# Altium footprint library DipComponent.PcbLib: 303 footprints (part 7 of 19)
Each footprint in its own frame and in the unit in brackets; x right, y up, seen from the top. Pads: shape width x height; smd on the part's side, far side on the other; paste and mask are expansions set on the pad; w line width, h text height; cw(c..) or ccw(c..) is an arc to the next point about the centre after c.
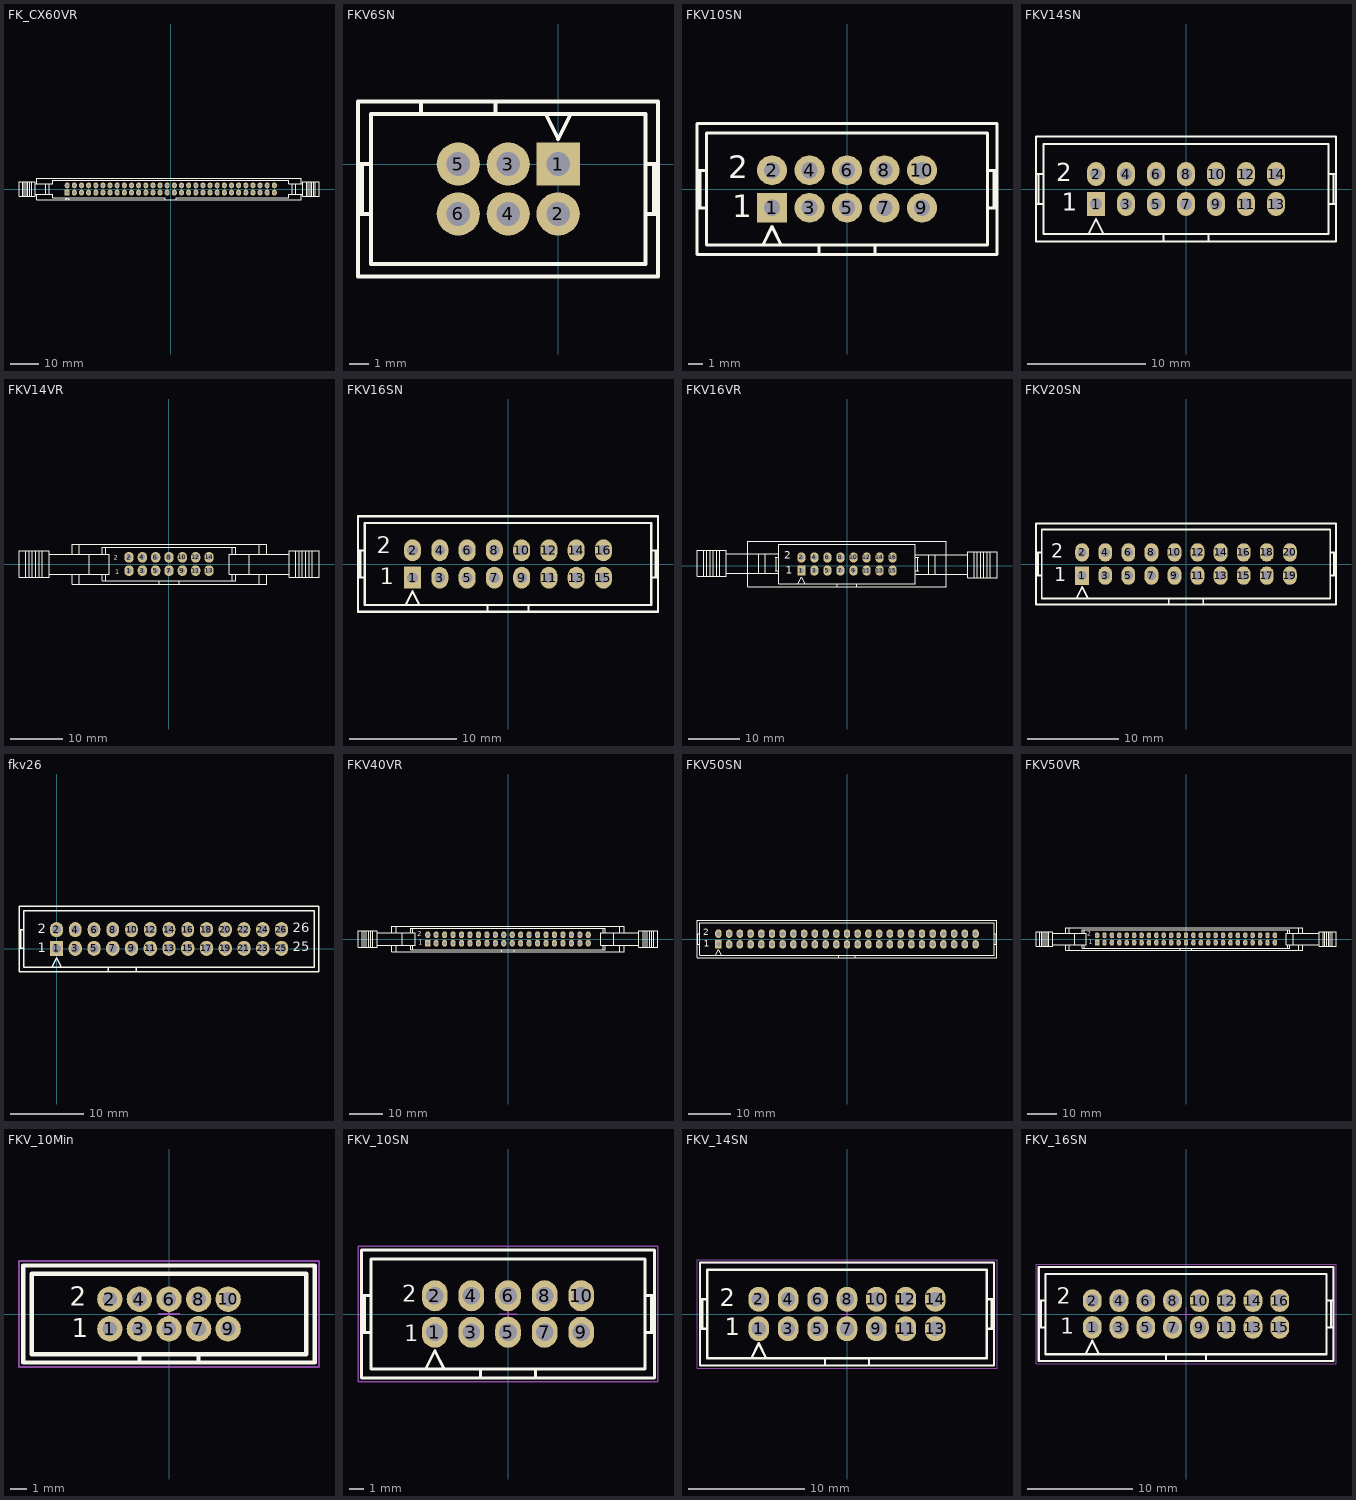
[diagram p6: the footprints below, top view; thin cyan lines are the x and y axes]

## FK_CX60VR [mil]
pads (60):
  rect 70x80 hole 43.31: 1(-1450,-50)
  oval 70x80 hole 43.31: 2(-1450,50) 3(-1350,-50) 4(-1350,50) 5(-1250,-50) 6(-1250,50) 7(-1150,-50) 8(-1150,50) 9(-1050,-50) 10(-1050,50) 11(-950,-50) 12(-950,50) 13(-850,-50) 14(-850,50) 15(-750,-50) 16(-750,50) 17(-650,-50) 18(-650,50) 19(-550,-50) 20(-550,50) 21(-450,-50) 22(-450,50) 23(-350,-50) 24(-350,50) 25(-250,-50) 26(-250,50) 27(-150,-50) 28(-150,50) 29(-50,-50) 30(-50,50) 31(50,-50) 32(50,50) 33(150,-50) 34(150,50) 35(250,-50) 36(250,50) 37(350,-50) 38(350,50) 39(450,-50) 40(450,50) 41(550,-50) 42(550,50) 43(650,-50) 44(650,50) 45(750,-50) 46(750,50) 47(850,-50) 48(850,50) 49(950,-50) 50(950,50) 51(1050,-50) 52(1050,50) 53(1150,-50) 54(1150,50) 55(1250,-50) 56(1250,50) 57(1350,-50) 58(1350,50) 59(1450,-50) 60(1450,50)
Top Overlay:
  lines w8: -2075,-100 -2075,100 ; -2050,-100 -2050,100 ; -2025,-100 -2025,100 ; -2000,-100 -2000,100 ; -1975,-100 -1975,100 ; -1950,-100 -1950,100 ; -1900,-75 -1650,-75 -1650,-125 -75,-125 -75,-150 ; -1900,75 -1650,75 -1650,125 1650,125 1650,75 1850,75 ; -1875,-75 -1875,-150 1825,-150 1825,-75 ; -1875,75 -1875,150 1825,150 1825,75 ; -1750,-75 -1750,75 ; -1700,-75 -1700,75 ; -1475,-150 -1450,-125 -1425,-150 ; 75,-150 75,-125 1650,-125 1650,-75 1850,-75 ; 1700,-75 1700,75 ; 1750,-75 1750,75 ; 1900,-100 1900,100 ; 1925,-100 1925,100 ; 1950,-100 1950,100 ; 1975,-100 1975,100 ; 2000,-100 2000,100 ; 2025,-100 2025,100 ; -2125,-100 -1900,-100 -1900,100 -2125,100 -2125,-100 ; 1850,-100 2075,-100 2075,100 1850,100 1850,-100

## FKV6SN [mm]
pads (6):
  rect 2.2x2.2 hole 1.2: 1(0,0)
  round 2.2 hole 1.2: 2(0,-2.54) 3(-2.54,0) 4(-2.54,-2.54) 5(-5.08,0) 6(-5.08,-2.54)
Top Overlay:
  lines w0.203: -10.18,-2.54 -9.525,-2.54 ; -10.18,0 -9.525,0 ; -9.98,-2.54 -9.98,0 ; -6.985,3.175 -6.985,2.54 ; -3.175,3.175 -3.175,2.54 ; -0.635,2.54 0,1.27 0.635,2.54 ; 4.445,-2.54 5.08,-2.54 ; 4.445,0 5.08,0 ; 4.868,-2.54 4.868,0 ; -6.985,2.54 -9.525,2.54 -9.525,-5.08 4.445,-5.08 4.445,2.54 -3.175,2.54 ; -6.985,2.54 -3.175,2.54 ; -10.18,-5.715 5.08,-5.715 5.08,3.175 -10.18,3.175 -10.18,-5.715
3D body "User Library-IDC Socket Male 6pin Straight THT Goldplated 2_54mm.STEP": height 8.91, standoff -3.49, extent -10.144,-5.932 5.076,2.918

## FKV10SN [mil]
pads (10):
  rect 80x80 hole 43.31: 1(-200,-50)
  round 80 hole 43.31: 2(-200,50) 3(-100,-50) 4(-100,50) 5(0,-50) 6(0,50) 7(100,-50) 8(100,50) 9(200,-50) 10(200,50)
Top Overlay:
  lines w8: -400,-50 -375,-50 ; -400,50 -375,50 ; -391.67,-50 -391.67,50 ; -225,-150 -200,-100 -175,-150 ; -75,-175 -75,-150 ; 75,-175 75,-150 ; 375,-50 400,-50 ; 375,50 400,50 ; 391.67,-50 391.67,50 ; -75,-150 75,-150 ; -75,-150 -375,-150 -375,150 375,150 375,-150 75,-150 ; -400,-175 400,-175 400,175 -400,175 -400,-175
  text "1" at -306,-76 h60
  text "2" at -317,29 h60

## FKV14SN [mil]
height 47.24
pads (14):
  rect 60x80 hole 39.37: 1(-300,-50)
  oval 60x80 hole 39.37: 2(-300,50) 3(-200,-50) 4(-200,50) 5(-100,-50) 6(-100,50) 7(0,-50) 8(0,50) 9(100,-50) 10(100,50) 11(200,-50) 12(200,50) 13(300,-50) 14(300,50)
Top Overlay:
  lines w8: -500,-50 -475,-50 ; -500,50 -475,50 ; -491.67,-50 -491.67,50 ; -325,-150 -300,-100 -275,-150 ; -75,-175 -75,-150 ; 75,-175 75,-150 ; 475,-50 500,-50 ; 475,50 500,50 ; 491.67,-50 491.67,50 ; -75,-150 -475,-150 -475,150 475,150 475,-150 75,-150 ; -75,-150 75,-150 ; -500,-175 -500,175 500,175 500,-175 -500,-175
  text "1" at -415,-73 h60
  text "2" at -432,26 h60

## FKV14VR [mil]
pads (14):
  oval 70x80 hole 39.37: 1(-299.78,-49.8) 2(-299.78,50.2) 3(-199.78,-49.8) 4(-199.78,50.2) 5(-99.78,-49.8) 6(-99.78,50.2) 7(0.22,-49.8) 8(0.22,50.2) 9(100.22,-49.8) 10(100.22,50.2) 11(200.22,-49.8) 12(200.22,50.2) 13(300.22,-49.8) 14(300.22,50.2)
Top Overlay:
  lines w8: -1074.78,-99.8 -1074.78,100.2 ; -1049.78,-99.8 -1049.78,100.2 ; -1024.78,-99.8 -1024.78,100.2 ; -999.78,-99.8 -999.78,100.2 ; -974.78,-99.8 -974.78,100.2 ; -949.78,-99.8 -949.78,100.2 ; -899.78,-74.8 -633.11,-74.8 -499.78,-74.8 ; -899.78,75.2 -633.11,75.2 -499.78,75.2 ; -724.78,-74.8 -724.78,-149.79 733.55,-149.79 733.55,-74.8 ; -724.78,75.2 -724.78,150.21 733.55,150.21 733.55,75.2 500.22,75.2 ; -674.78,-149.79 -674.78,-74.8 ; -674.78,75.2 -674.78,150.21 ; -599.78,-74.8 -599.78,75.2 ; -474.78,-124.8 -474.78,-74.8 ; -474.78,75.2 -474.78,125.2 ; -74.78,-149.79 -74.78,-124.8 ; 75.22,-149.79 75.22,-124.8 ; 475.22,-124.8 475.22,-74.8 ; 475.22,75.2 475.22,125.2 ; 600.22,-74.8 600.22,75.2 ; 633.55,75.2 900.22,75.2 ; 675.22,-149.79 675.22,-74.8 ; 675.22,75.2 675.22,150.21 ; 900.22,-74.8 633.55,-74.8 500.22,-74.8 ; 950.22,-99.8 950.22,100.2 ; 975.22,-99.8 975.22,100.2 ; 1000.22,-99.8 1000.22,100.2 ; 1025.22,-99.8 1025.22,100.2 ; 1050.22,-99.8 1050.22,100.2 ; 1075.22,-99.8 1075.22,100.2 ; -499.78,-74.8 -499.78,-124.8 -74.78,-124.8 ; -499.78,-74.8 -449.78,-74.8 -449.78,75.2 -499.78,75.2 ; -499.78,75.2 -499.78,125.2 500.22,125.2 500.22,75.2 ; -74.78,-124.8 75.22,-124.8 ; 75.22,-124.8 500.22,-124.8 500.22,-74.8 ; 500.22,-74.8 450.22,-74.8 450.22,75.2 500.22,75.2 ; -1124.78,-99.8 -899.78,-99.8 -899.78,100.2 -1124.78,100.2 -1124.78,-99.8 ; 900.22,-99.8 1125.22,-99.8 1125.22,100.2 900.22,100.2 900.22,-99.8
  text "1" at -401.78,-77.8 h35
  text "2" at -413.78,32.2 h35

## FKV16SN [mil]
pads (16):
  rect 62x80 hole 39.37: 1(-350,-50)
  oval 62x80 hole 39.37: 2(-350,50) 3(-250,-50) 4(-250,50) 5(-150,-50) 6(-150,50) 7(-50,-50) 8(-50,50) 9(50,-50) 10(50,50) 11(150,-50) 12(150,50) 13(250,-50) 14(250,50) 15(350,-50) 16(350,50)
Top Overlay:
  lines w8: -550,-50 -525,-50 ; -550,50 -525,50 ; -541.67,-50 -541.67,50 ; -375,-150 -350,-100 -325,-150 ; -75,-175 -75,-150 ; 75,-175 75,-150 ; 525,-50 550,-50 ; 525,50 550,50 ; 541.67,-50 541.67,-41.67 541.67,50 ; -75,-150 75,-150 ; -75,-150 -525,-150 -525,150 525,150 525,-150 75,-150 ; -550,-175 550,-175 550,175 -550,175 -550,-175
  text "1" at -470,-74 h60
  text "2" at -482,39 h60

## FKV16VR [mil]
pads (16):
  rect 62x80 hole 39.37: 1(-350,-35)
  oval 62x80 hole 39.37: 2(-350,65) 3(-250,-35) 4(-250,65) 5(-150,-35) 6(-150,65) 7(-50,-35) 8(-50,65) 9(50,-35) 10(50,65) 11(150,-35) 12(150,65) 13(250,-35) 14(250,65) 15(350,-35) 16(350,65)
Top Overlay:
  lines w8: -1100,-80 -1100,120 ; -1075,-80 -1075,120 ; -1050,-80 -1050,120 ; -1025,-80 -1025,120 ; -1000,-80 -1000,120 ; -975,-80 -975,120 ; -925,-55 -525,-55 -525,-105 ; -925,95 -525,95 -525,145 ; -675,-55 -675,95 ; -625,-55 -625,95 ; -550,-35 -525,-35 ; -550,65 -525,65 ; -541.67,-35 -541.67,65 ; -375,-135 -350,-85 -325,-135 ; -75,-160 -75,-135 ; 75,-160 75,-135 ; 525,-115 525,-65 925,-65 ; 525,-35 550,-35 ; 525,65 550,65 ; 525,135 525,85 925,85 ; 541.67,-35 541.67,-26.67 541.67,65 ; 625,-65 625,85 ; 675,-65 675,85 ; 975,-90 975,110 ; 1000,-90 1000,110 ; 1025,-90 1025,110 ; 1050,-90 1050,110 ; 1075,-90 1075,110 ; 1100,-90 1100,110 ; -550,190 760,190 ; -550,190 760,190 ; -550,190 760,190 ; -75,-135 75,-135 ; -75,-135 -525,-135 -525,165 525,165 525,-135 75,-135 ; 760,190 -760,190 -760,-160 760,-160 760,190 ; -1150,-80 -925,-80 -925,120 -1150,120 -1150,-80 ; 925,-90 925,110 1150,110 1150,-90 925,-90
  text "1" at -470,-59 h60
  text "2" at -482,54 h60

## FKV20SN [mil]
height 47.24
pads (20):
  rect 60x80 hole 39.37: 1(-450,-50)
  oval 60x80 hole 39.37: 2(-450,50) 3(-350,-50) 4(-350,50) 5(-250,-50) 6(-250,50) 7(-150,-50) 8(-150,50) 9(-50,-50) 10(-50,50) 11(50,-50) 12(50,50) 13(150,-50) 14(150,50) 15(250,-50) 16(250,50) 17(350,-50) 18(350,50) 19(450,-50) 20(450,50)
Top Overlay:
  lines w8: -650,-50 -625,-50 ; -650,50 -625,50 ; -641.67,-50 -641.67,50 ; -475,-150 -450,-100 -425,-150 ; -75,-175 -75,-150 ; 75,-175 75,-150 ; 625,-50 650,-50 ; 625,50 650,50 ; 641.67,-50 641.67,50 ; -75,-150 75,-150 ; -75,-150 -625,-150 -625,150 625,150 625,-150 75,-150 ; -650,-175 650,-175 650,175 -650,175 -650,-175
  text "1" at -572,-75 h60
  text "2" at -585,27 h60

## fkv26 [mil]
pads (26):
  rect 70.87x80 hole 47.24: 1(0,1)
  oval 70.87x80 hole 47.24: 2(0,101) 3(100,1) 5(200,1) 7(300,1) 9(400,1) 11(500,1) 13(600,1) 15(700,1) 17(800,1) 18(800,101) 19(900,1) 20(900,101) 21(1000,1) 23(1100,1) 24(1100,101) 25(1200,1) 26(1200,101)
  oval 66.93x80 hole 47.24: 4(100,101) 6(200,101) 8(300,101) 10(400,101) 12(500,101) 14(600,101) 16(700,101) 22(1000,101)
Top Overlay:
  lines w8: -200,1 -175,1 ; -200,101 -175,101 ; -191.67,1 -191.67,101 ; -25,-99 0,-49 25,-99 ; 275,-124 275,-99 ; 425,-124 425,-99 ; 275,-99 -175,-99 -175,201 1375,201 1375,-99 425,-99 ; 275,-99 425,-99 ; -200,-124 -200,226 1400,226 1400,-124 -200,-124
  text "26" at 1260,86 h50
  text "25" at 1260,-14 h50
  text "1" at -100,-19 h50
  text "2" at -100,81 h50

## FKV40VR [mil]
height 47.24
pads (40):
  rect 60x80 hole 39.37: 1(-950,-50)
  oval 60x80 hole 39.37: 2(-950,50) 3(-850,-50) 4(-850,50) 5(-750,-50) 6(-750,50) 7(-650,-50) 8(-650,50) 9(-550,-50) 10(-550,50) 11(-450,-50) 12(-450,50) 13(-350,-50) 14(-350,50) 15(-250,-50) 16(-250,50) 17(-150,-50) 18(-150,50) 19(-50,-50) 20(-50,50) 21(50,-50) 22(50,50) 23(150,-50) 24(150,50) 25(250,-50) 26(250,50) 27(350,-50) 28(350,50) 29(450,-50) 30(450,50) 31(550,-50) 32(550,50) 33(650,-50) 34(650,50) 35(750,-50) 36(750,50) 37(850,-50) 38(850,50) 39(950,-50) 40(950,50)
Top Overlay:
  lines w8: -1725,-100 -1725,100 ; -1700,-100 -1700,100 ; -1675,-100 -1675,100 ; -1650,-100 -1650,100 ; -1625,-100 -1625,100 ; -1600,-100 -1600,100 ; -1550,-75 -1150,-75 ; -1550,75 -1150,75 ; -1375,-75 -1375,-150 1375,-150 1375,-75 ; -1375,75 -1375,150 1375,150 1375,75 ; -1325,-150 -1325,-75 ; -1325,75 -1325,150 ; -1250,-75 -1250,75 ; -1125,-125 -1125,-75 ; -1125,75 -1125,125 ; -75,-150 -75,-125 ; 75,-150 75,-125 ; 1125,-125 1125,-75 ; 1125,75 1125,125 ; 1250,-75 1250,75 ; 1325,-150 1325,-75 ; 1325,75 1325,150 ; 1550,-75 1150,-75 ; 1550,75 1150,75 ; 1600,-100 1600,100 ; 1625,-100 1625,100 ; 1650,-100 1650,100 ; 1675,-100 1675,100 ; 1700,-100 1700,100 ; 1725,-100 1725,100 ; -1150,-75 -1100,-75 -1100,75 -1150,75 ; -1150,-75 -1150,-125 -75,-125 ; -1150,75 -1150,125 1150,125 1150,75 ; -75,-125 75,-125 ; 75,-125 1150,-125 1150,-75 ; 1150,-75 1100,-75 1100,75 1150,75 ; 1775,-100 1775,100 ; 1775,-100 1775,100 ; 1775,-100 1775,100 ; 1775,-100 1550,-100 1550,100 1775,100 ; -1775,-100 -1775,100 -1550,100 -1550,-100 -1775,-100
  text "2" at -1072,35 h60
  text "1" at -1062,-70 h60

## FKV50SN [mil]
height 47.24
pads (50):
  rect 60x80 hole 39.37: 1(-1200,-50)
  oval 60x80 hole 39.37: 2(-1200,50) 3(-1100,-50) 4(-1100,50) 5(-1000,-50) 6(-1000,50) 7(-900,-50) 8(-900,50) 9(-800,-50) 10(-800,50) 11(-700,-50) 12(-700,50) 13(-600,-50) 14(-600,50) 15(-500,-50) 16(-500,50) 17(-400,-50) 18(-400,50) 19(-300,-50) 20(-300,50) 21(-200,-50) 22(-200,50) 23(-100,-50) 24(-100,50) 25(0,-50) 26(0,50) 27(100,-50) 28(100,50) 29(200,-50) 30(200,50) 31(300,-50) 32(300,50) 33(400,-50) 34(400,50) 35(500,-50) 36(500,50) 37(600,-50) 38(600,50) 39(700,-50) 40(700,50) 41(800,-50) 42(800,50) 43(900,-50) 44(900,50) 45(1000,-50) 46(1000,50) 47(1100,-50) 48(1100,50) 49(1200,-50) 50(1200,50)
Top Overlay:
  lines w8: -1400,-50 -1375,-50 ; -1400,50 -1375,50 ; -1391.67,-50 -1391.67,50 ; -1225,-150 -1200,-100 -1175,-150 ; -75,-175 -75,-150 ; 75,-175 75,-150 ; 1375,-50 1400,-50 ; 1375,50 1400,50 ; 1391.67,-50 1391.67,50 ; -75,-150 75,-150 ; -75,-150 -1375,-150 -1375,150 1375,150 1375,-150 75,-150 ; -1400,-175 1400,-175 1400,175 -1400,175 -1400,-175
  text "2" at -1343,34 h60
  text "1" at -1335,-71 h60

## FKV50VR [mil]
pads (50):
  rect 60x80 hole 39.37: 1(-1200,-50)
  oval 60x80 hole 39.37: 2(-1200,50) 3(-1100,-50) 4(-1100,50) 5(-1000,-50) 6(-1000,50) 7(-900,-50) 8(-900,50) 9(-800,-50) 10(-800,50) 11(-700,-50) 12(-700,50) 13(-600,-50) 14(-600,50) 15(-500,-50) 16(-500,50) 17(-400,-50) 18(-400,50) 19(-300,-50) 20(-300,50) 21(-200,-50) 22(-200,50) 23(-100,-50) 24(-100,50) 25(0,-50) 26(0,50) 27(100,-50) 28(100,50) 29(200,-50) 30(200,50) 31(300,-50) 32(300,50) 33(400,-50) 34(400,50) 35(500,-50) 36(500,50) 37(600,-50) 38(600,50) 39(700,-50) 40(700,50) 41(800,-50) 42(800,50) 43(900,-50) 44(900,50) 45(1000,-50) 46(1000,50) 47(1100,-50) 48(1100,50) 49(1200,-50) 50(1200,50)
Top Overlay:
  lines w8: -1975,-100 -1975,100 ; -1950,-100 -1950,100 ; -1925,-100 -1925,100 ; -1900,-100 -1900,100 ; -1875,-100 -1875,100 ; -1850,-100 -1850,100 ; -1800,-75 -1400,-75 ; -1800,75 -1400,75 ; -1625,-75 -1625,-150 1575,-150 1575,-75 ; -1625,75 -1625,150 1575,150 1575,75 ; -1575,-150 -1575,-75 ; -1575,75 -1575,150 ; -1500,-75 -1500,75 ; -1375,-125 -1375,-75 ; -1375,75 -1375,125 ; -75,-150 -75,-125 ; 75,-150 75,-125 ; 1375,-125 1375,-75 ; 1375,75 1375,125 ; 1450,-75 1450,75 ; 1525,-150 1525,-75 ; 1525,75 1525,150 ; 1800,-75 1400,-75 ; 1800,75 1400,75 ; 1850,-100 1850,100 ; 1875,-100 1875,100 ; 1900,-100 1900,100 ; 1925,-100 1925,100 ; 1950,-100 1950,100 ; 1975,-100 1975,100 ; -1400,-75 -1350,-75 -1350,75 -1400,75 ; -1400,-75 -1400,-125 -75,-125 ; -1400,75 -1400,125 1400,125 1400,75 ; -75,-125 75,-125 ; 75,-125 1400,-125 1400,-75 ; 1400,-75 1350,-75 1350,75 1400,75 ; -2025,-100 -2025,100 -1800,100 -1800,-100 -2025,-100 ; 1800,-100 1800,100 2025,100 2025,-100 1800,-100
  text "2" at -1330,47 h60
  text "1" at -1314,-73 h60

## FKV_10Min [mil] "Connector; BoxHeader; 5x2 Position ,2.54mm Pitch"
height 346.46
pads (10):
  round 60 hole 34: 1(-140,-35) 2(-140,35) 3(-70,-35) 4(-70,35) 5(0,-35) 6(0,35) 7(70,-35) 8(70,35) 9(140,-35) 10(140,35)
Top Overlay:
  lines w10: -70,-115 -70,-95 ; 70,-115 70,-95 ; -345,-115 345,-115 345,115 -345,115 -345,-115 ; -325,-95 325,-95 325,95 -325,95 -325,-95
  text "2" at -235,20 h45
  text "1" at -230,-55 h45
Mechanical 15:
  lines w5: -25,0 0,0 ; 0,-25 0,0 ; 0,25 0,0 ; 25,0 0,0 ; -355,-125 355,-125 355,125 -330,125 -355,125 -355,-125
3D body: height 220, standoff 0, extent 70,-110 340,-90
3D body: height 220, standoff 0, extent -340,-110 -70,-90
3D body: height 220, standoff 0, extent 320,-110 340,110
3D body: height 220, standoff 0, extent -340,90 340,110
3D body: height 220, standoff 0, extent -340,-110 -320,110
3D body: height 20, standoff 0, extent -340,-110 340,110
3D body: height 220, standoff -110, extent -150,-45 -130,-25
3D body: height 220, standoff -110, extent -80,-45 -60,-25
3D body: height 220, standoff -110, extent -10,-45 10,-25
3D body: height 220, standoff -110, extent 60,-45 80,-25
3D body: height 220, standoff -110, extent 130,-45 150,-25
3D body: height 220, standoff -110, extent 130,25 150,45
3D body: height 220, standoff -110, extent 60,25 80,45
3D body: height 220, standoff -110, extent -10,25 10,45
3D body: height 220, standoff -110, extent -80,25 -60,45
3D body: height 220, standoff -110, extent -150,25 -130,45

## FKV_10SN [mil] "Connector; BoxHeader; 5x2 Position ,2.54mm Pitch"
height 346.46
pads (10):
  oval 70x85 hole 48: 1(-200,-50) 2(-200,50) 3(-100,-50) 4(-100,50) 5(0,-50) 6(0,50) 7(100,-50) 8(100,50) 9(200,-50) 10(200,50)
Top Overlay:
  lines w8: -400,-50 -375,-50 ; -400,50 -375,50 ; -391.67,-50 -391.67,50 ; -225,-150 -200,-100 -175,-150 ; -75,-175 -75,-150 ; 75,-175 75,-150 ; 375,-50 400,-50 ; 375,50 400,50 ; 391.67,-50 391.67,50 ; -75,-150 75,-150 ; -75,-150 -375,-150 -375,150 375,150 375,-150 75,-150 ; -400,-175 -400,175 400,175 400,-175 -400,-175
  text "1" at -283,-75 h45
  text "2" at -289,33 h45
Mechanical 13:
  lines w3.94: -75,-175 -75,-150 ; 75,-175 75,-150 ; -75,-150 -375,-150 -375,150 375,150 375,-150 75,-150 ; -75,-150 75,-150 ; 87.5,-62.5 87.5,-50 ; 87.5,-62.5 100,-62.5 ; 87.5,-62.5 87.5,-50 ; 87.5,-62.5 100,-62.5 ; 87.5,-50 87.5,-37.5 ; 87.5,-50 87.5,-37.5 ; 87.5,-37.5 100,-37.5 ; 87.5,-37.5 100,-37.5 ; 100,-62.5 112.5,-62.5 ; 100,-62.5 112.5,-62.5 ; 100,-37.5 112.5,-37.5 ; 100,-37.5 112.5,-37.5 ; 112.5,-62.5 112.5,-50 ; 112.5,-62.5 112.5,-50 ; 112.5,-50 112.5,-37.5 ; 112.5,-50 112.5,-37.5 ; -400,-175 400,-175 400,175 -400,175 -400,-175 ; -212.5,-62.5 -200,-62.5 -187.5,-62.5 -187.5,-50 -187.5,-37.5 -200,-37.5 -212.5,-37.5 -212.5,-50 -212.5,-62.5 ; -212.5,37.5 -212.5,50 -212.5,62.5 -200,62.5 -187.5,62.5 -187.5,50 -187.5,37.5 -200,37.5 -212.5,37.5 ; -112.5,-62.5 -112.5,-50 -112.5,-37.5 -100,-37.5 -87.5,-37.5 -87.5,-50 -87.5,-62.5 -100,-62.5 -112.5,-62.5 ; -112.5,37.5 -112.5,50 -112.5,62.5 -100,62.5 -87.5,62.5 -87.5,50 -87.5,37.5 -100,37.5 -112.5,37.5 ; -12.5,-62.5 -12.5,-50 -12.5,-37.5 0,-37.5 12.5,-37.5 12.5,-50 12.5,-62.5 0,-62.5 -12.5,-62.5 ; -12.5,37.5 -12.5,50 -12.5,62.5 0,62.5 12.5,62.5 12.5,50 12.5,37.5 0,37.5 -12.5,37.5 ; 87.5,37.5 87.5,50 87.5,62.5 100,62.5 112.5,62.5 112.5,50 112.5,37.5 100,37.5 87.5,37.5 ; 187.5,-62.5 187.5,-50 187.5,-37.5 200,-37.5 212.5,-37.5 212.5,-50 212.5,-62.5 200,-62.5 187.5,-62.5 ; 187.5,37.5 187.5,50 187.5,62.5 200,62.5 212.5,62.5 212.5,50 212.5,37.5 200,37.5 187.5,37.5
Mechanical 15:
  lines w3.94: -25,0 0,0 ; 0,-25 0,0 ; 0,25 0,0 ; 25,0 0,0 ; -410,-185 -410,185 410,185 410,-185 -410,-185
3D body: height 346.46, standoff 0, extent -399.98,-174.98 399.98,174.98
3D body: height 78.74, standoff 0, extent -374.98,-149.98 374.98,149.98
3D body: height 118.11, standoff 0, extent -74.98,-174.98 74.98,-150.02
3D body: height 314.96, standoff -129.92, extent -212.48,-62.48 -187.52,-37.52
3D body: height 314.96, standoff -129.92, extent -112.48,-62.48 -87.52,-37.52
3D body: height 314.96, standoff -129.92, extent -12.48,-62.48 12.48,-37.52
3D body: height 314.96, standoff -129.92, extent 87.52,-62.48 112.48,-37.52
3D body: height 314.96, standoff -129.92, extent 187.52,-62.48 212.48,-37.52
3D body: height 314.96, standoff -129.92, extent 187.52,37.52 212.48,62.48
3D body: height 314.96, standoff -129.92, extent 87.52,37.52 112.48,62.48
3D body: height 314.96, standoff -129.92, extent -12.48,37.52 12.48,62.48
3D body: height 314.96, standoff -129.92, extent -112.48,37.52 -87.52,62.48
3D body: height 314.96, standoff -129.92, extent -212.48,37.52 -187.52,62.48

## FKV_14SN [mil] "Connector; BoxHeader; 7x2 Position ,2.54mm Pitch"
height 346.46
pads (14):
  oval 70x85 hole 48: 1(-300,-50) 2(-300,50) 3(-200,-50) 4(-200,50) 5(-100,-50) 6(-100,50) 7(0,-50) 8(0,50) 9(100,-50) 10(100,50) 11(200,-50) 12(200,50) 13(300,-50) 14(300,50)
Top Overlay:
  lines w8: -500,-50 -475,-50 ; -500,50 -475,50 ; -491.67,-50 -491.67,50 ; -325,-150 -300,-100 -275,-150 ; -75,-175 -75,-150 ; 75,-175 75,-150 ; 475,-50 500,-50 ; 475,50 500,50 ; 491.67,-50 491.67,50 ; -75,-150 -475,-150 -475,150 475,150 475,-150 75,-150 ; -75,-150 75,-150 ; -500,-175 -500,175 500,175 500,-175 -500,-175
  text "1" at -415,-73 h60
  text "2" at -432,26 h60
Mechanical 13:
  lines w3.94: -75,-175 -75,-150 ; 75,-175 75,-150 ; -75,-150 75,-150 ; -75,-150 -475,-150 -475,150 475,150 475,-150 75,-150 ; -500,-175 500,-175 500,175 -500,175 -500,-175 ; -312.5,-62.5 -312.5,-50 -312.5,-37.5 -300,-37.5 -287.5,-37.5 -287.5,-50 -287.5,-62.5 -300,-62.5 -312.5,-62.5 ; -312.5,37.5 -300,37.5 -287.5,37.5 -287.5,50 -287.5,62.5 -300,62.5 -312.5,62.5 -312.5,50 -312.5,37.5 ; -212.5,-62.5 -200,-62.5 -187.5,-62.5 -187.5,-50 -187.5,-37.5 -200,-37.5 -212.5,-37.5 -212.5,-50 -212.5,-62.5 ; -212.5,37.5 -200,37.5 -187.5,37.5 -187.5,50 -187.5,62.5 -200,62.5 -212.5,62.5 -212.5,50 -212.5,37.5 ; -112.5,-62.5 -112.5,-50 -112.5,-37.5 -100,-37.5 -87.5,-37.5 -87.5,-50 -87.5,-62.5 -100,-62.5 -112.5,-62.5 ; -112.5,37.5 -100,37.5 -87.5,37.5 -87.5,50 -87.5,62.5 -100,62.5 -112.5,62.5 -112.5,50 -112.5,37.5 ; -12.5,-62.5 0,-62.5 12.5,-62.5 12.5,-50 12.5,-37.5 0,-37.5 -12.5,-37.5 -12.5,-50 -12.5,-62.5 ; -12.5,37.5 0,37.5 12.5,37.5 12.5,50 12.5,62.5 0,62.5 -12.5,62.5 -12.5,50 -12.5,37.5 ; 87.5,-62.5 87.5,-50 87.5,-37.5 100,-37.5 112.5,-37.5 112.5,-50 112.5,-62.5 100,-62.5 87.5,-62.5 ; 87.5,37.5 100,37.5 112.5,37.5 112.5,50 112.5,62.5 100,62.5 87.5,62.5 87.5,50 87.5,37.5 ; 187.5,-62.5 200,-62.5 212.5,-62.5 212.5,-50 212.5,-37.5 200,-37.5 187.5,-37.5 187.5,-50 187.5,-62.5 ; 187.5,37.5 200,37.5 212.5,37.5 212.5,50 212.5,62.5 200,62.5 187.5,62.5 187.5,50 187.5,37.5 ; 287.5,-62.5 287.5,-50 287.5,-37.5 300,-37.5 312.5,-37.5 312.5,-50 312.5,-62.5 300,-62.5 287.5,-62.5 ; 287.5,37.5 300,37.5 312.5,37.5 312.5,50 312.5,62.5 300,62.5 287.5,62.5 287.5,50 287.5,37.5
Mechanical 15:
  lines w3.94: -25,0 0,0 ; 0,-25 0,0 ; 0,25 0,0 ; 25,0 0,0 ; -510,-185 -510,185 510,185 510,-185 -510,-185
3D body: height 314.96, standoff -129.92, extent 287.52,37.52 312.48,62.48
3D body: height 314.96, standoff -129.92, extent 287.52,-62.48 312.48,-37.52
3D body: height 314.96, standoff -129.92, extent 87.52,37.52 112.48,62.48
3D body: height 314.96, standoff -129.92, extent 187.52,37.52 212.48,62.48
3D body: height 314.96, standoff -129.92, extent 187.52,-62.48 212.48,-37.52
3D body: height 314.96, standoff -129.92, extent 87.52,-62.48 112.48,-37.52
3D body: height 314.96, standoff -129.92, extent -112.48,37.52 -87.52,62.48
3D body: height 314.96, standoff -129.92, extent -12.48,37.52 12.48,62.48
3D body: height 314.96, standoff -129.92, extent -12.48,-62.48 12.48,-37.52
3D body: height 314.96, standoff -129.92, extent -112.48,-62.48 -87.52,-37.52
3D body: height 314.96, standoff -129.92, extent -312.48,37.52 -287.52,62.48
3D body: height 314.96, standoff -129.92, extent -212.48,37.52 -187.52,62.48
3D body: height 314.96, standoff -129.92, extent -212.48,-62.48 -187.52,-37.52
3D body: height 314.96, standoff -129.92, extent -312.48,-62.48 -287.52,-37.52
3D body: height 346.46, standoff 0, extent -499.98,-174.98 499.98,174.98
3D body: height 78.74, standoff 0, extent -474.98,-149.98 474.98,149.98
3D body: height 118.11, standoff 0, extent -74.98,-174.98 74.98,-150.02

## FKV_16SN [mil] "Connector; BoxHeader; 8x2 Position ,2.54mm Pitch"
height 346.46
pads (16):
  oval 70x85 hole 48: 1(-350,-50) 2(-350,50) 3(-250,-50) 4(-250,50) 5(-150,-50) 6(-150,50) 7(-50,-50) 8(-50,50) 9(50,-50) 10(50,50) 11(150,-50) 12(150,50) 13(250,-50) 14(250,50) 15(350,-50) 16(350,50)
Top Overlay:
  lines w8: -550,-50 -525,-50 ; -550,50 -525,50 ; -541.67,-50 -541.67,50 ; -375,-150 -350,-100 -325,-150 ; -75,-175 -75,-150 ; 75,-175 75,-150 ; 525,-50 550,-50 ; 525,50 550,50 ; 541.67,-50 541.67,-41.67 541.67,50 ; -75,-150 75,-150 ; -75,-150 -525,-150 -525,150 525,150 525,-150 75,-150 ; -550,-175 550,-175 550,175 -550,175 -550,-175
  text "1" at -470,-74 h60
  text "2" at -482,39 h60
Mechanical 13:
  lines w3.94: -75,-175 -75,-150 ; 75,-175 75,-150 ; -75,-150 -525,-150 -525,150 525,150 525,-150 75,-150 ; -75,-150 75,-150 ; -550,-175 -550,175 550,175 550,-175 -550,-175 ; -362.5,-62.5 -362.5,-50 -362.5,-37.5 -350,-37.5 -337.5,-37.5 -337.5,-50 -337.5,-62.5 -350,-62.5 -362.5,-62.5 ; -362.5,37.5 -350,37.5 -337.5,37.5 -337.5,50 -337.5,62.5 -350,62.5 -362.5,62.5 -362.5,50 -362.5,37.5 ; -262.5,-62.5 -250,-62.5 -237.5,-62.5 -237.5,-50 -237.5,-37.5 -250,-37.5 -262.5,-37.5 -262.5,-50 -262.5,-62.5 ; -262.5,37.5 -250,37.5 -237.5,37.5 -237.5,50 -237.5,62.5 -250,62.5 -262.5,62.5 -262.5,50 -262.5,37.5 ; -162.5,-62.5 -162.5,-50 -162.5,-37.5 -150,-37.5 -137.5,-37.5 -137.5,-50 -137.5,-62.5 -150,-62.5 -162.5,-62.5 ; -162.5,37.5 -150,37.5 -137.5,37.5 -137.5,50 -137.5,62.5 -150,62.5 -162.5,62.5 -162.5,50 -162.5,37.5 ; -62.5,-62.5 -50,-62.5 -37.5,-62.5 -37.5,-50 -37.5,-37.5 -50,-37.5 -62.5,-37.5 -62.5,-50 -62.5,-62.5 ; -62.5,37.5 -50,37.5 -37.5,37.5 -37.5,50 -37.5,62.5 -50,62.5 -62.5,62.5 -62.5,50 -62.5,37.5 ; 37.5,-62.5 37.5,-50 37.5,-37.5 50,-37.5 62.5,-37.5 62.5,-50 62.5,-62.5 50,-62.5 37.5,-62.5 ; 37.5,37.5 50,37.5 62.5,37.5 62.5,50 62.5,62.5 50,62.5 37.5,62.5 37.5,50 37.5,37.5 ; 137.5,-62.5 150,-62.5 162.5,-62.5 162.5,-50 162.5,-37.5 150,-37.5 137.5,-37.5 137.5,-50 137.5,-62.5 ; 137.5,37.5 150,37.5 162.5,37.5 162.5,50 162.5,62.5 150,62.5 137.5,62.5 137.5,50 137.5,37.5 ; 237.5,-62.5 237.5,-50 237.5,-37.5 250,-37.5 262.5,-37.5 262.5,-50 262.5,-62.5 250,-62.5 237.5,-62.5 ; 237.5,37.5 250,37.5 262.5,37.5 262.5,50 262.5,62.5 250,62.5 237.5,62.5 237.5,50 237.5,37.5 ; 337.5,-62.5 350,-62.5 362.5,-62.5 362.5,-50 362.5,-37.5 350,-37.5 337.5,-37.5 337.5,-50 337.5,-62.5 ; 337.5,37.5 350,37.5 362.5,37.5 362.5,50 362.5,62.5 350,62.5 337.5,62.5 337.5,50 337.5,37.5
Mechanical 15:
  lines w3.94: -25,0 0,0 ; 0,-25 0,0 ; 0,25 0,0 ; 25,0 0,0 ; -560,-185 560,-185 560,185 -560,185 -560,-185
3D body: height 118.11, standoff 0, extent -74.98,-174.98 74.98,-150.02
3D body: height 78.74, standoff 0, extent -524.98,-149.98 524.98,149.98
3D body: height 346.46, standoff 0, extent -549.98,-174.98 549.98,174.98
3D body: height 314.96, standoff -129.92, extent -362.48,37.52 -337.52,62.48
3D body: height 314.96, standoff -129.92, extent -262.48,37.52 -237.52,62.48
3D body: height 314.96, standoff -129.92, extent -262.48,-62.48 -237.52,-37.52
3D body: height 314.96, standoff -129.92, extent -362.48,-62.48 -337.52,-37.52
3D body: height 314.96, standoff -129.92, extent -162.48,37.52 -137.52,62.48
3D body: height 314.96, standoff -129.92, extent -62.48,37.52 -37.52,62.48
3D body: height 314.96, standoff -129.92, extent -62.48,-62.48 -37.52,-37.52
3D body: height 314.96, standoff -129.92, extent -162.48,-62.48 -137.52,-37.52
3D body: height 314.96, standoff -129.92, extent 37.52,37.52 62.48,62.48
3D body: height 314.96, standoff -129.92, extent 137.52,37.52 162.48,62.48
3D body: height 314.96, standoff -129.92, extent 137.52,-62.48 162.48,-37.52
3D body: height 314.96, standoff -129.92, extent 37.52,-62.48 62.48,-37.52
3D body: height 314.96, standoff -129.92, extent 237.52,37.52 262.48,62.48
3D body: height 314.96, standoff -129.92, extent 337.52,37.52 362.48,62.48
3D body: height 314.96, standoff -129.92, extent 337.52,-62.48 362.48,-37.52
3D body: height 314.96, standoff -129.92, extent 237.52,-62.48 262.48,-37.52